# Altium footprint library Potentiometer.PcbLib: 55 footprints (part 4 of 4)
Each footprint in its own frame and in the unit in brackets; x right, y up, seen from the top. Pads: shape width x height; smd on the part's side, far side on the other; paste and mask are expansions set on the pad; w line width, h text height; cw(c..) or ccw(c..) is an arc to the next point about the centre after c.
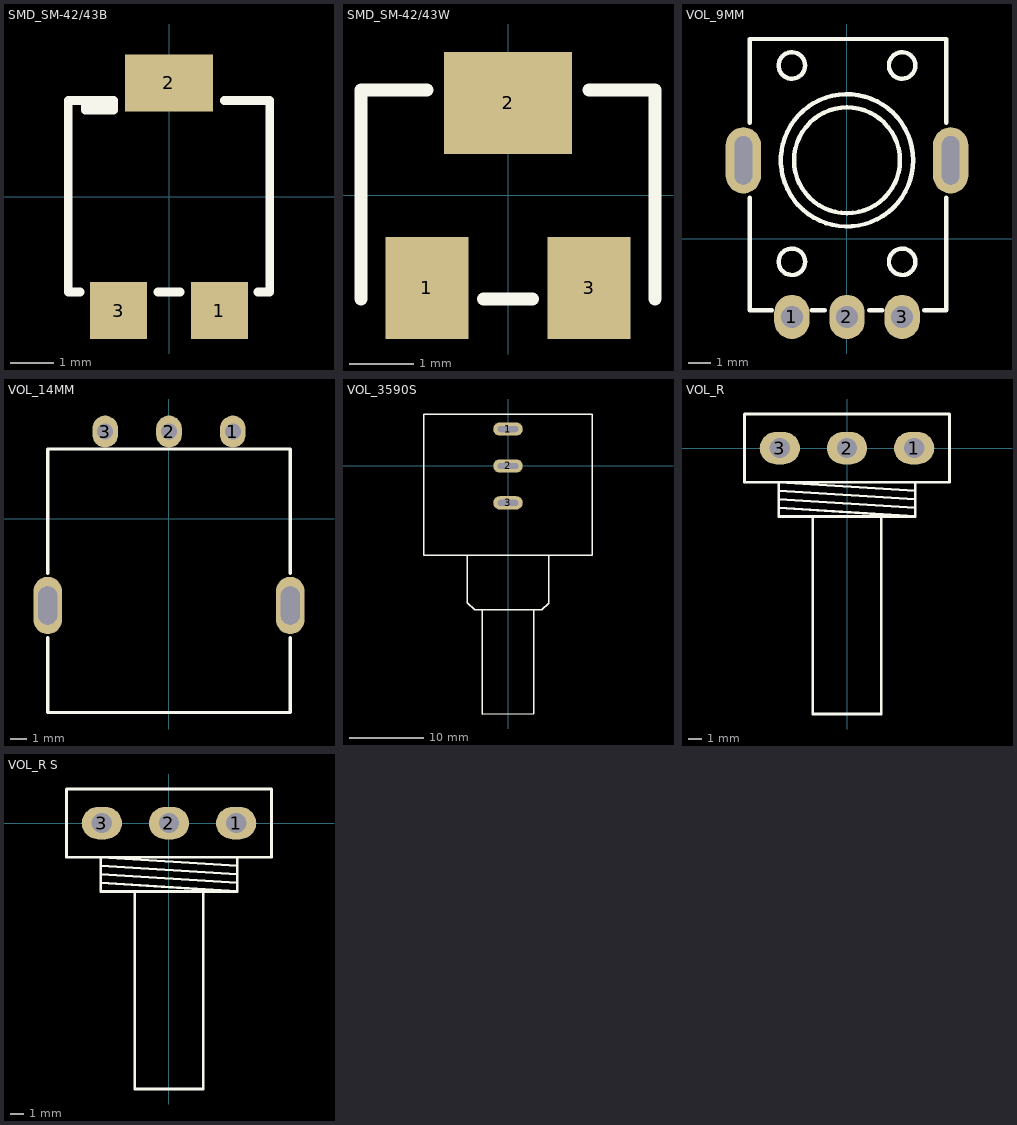
[diagram p3: the footprints below, top view; thin cyan lines are the x and y axes]

## SMD_SM-42/43B [mm]
pads (3):
  rect 1.3x1.3 smd: 1(1.15,-2.6) 3(-1.15,-2.6)
  rect 2x1.3 smd: 2(0,2.6)
Top Overlay:
  rectangle: -1.905,1.975 -1.27,2.3
  lines w0.203: -2.032,-2.175 -2.3,-2.175 -2.3,2.2 -1.27,2.2 -1.27,1.975 -1.905,1.975 -1.905,2.2 ; -0.254,-2.175 0.254,-2.175 ; 1.27,2.2 2.3,2.2 2.3,-2.175 2.032,-2.175
3D body "SW3dPS-Bourns 3314G potentiometer x1.STEP": height 2.55, standoff 0, extent -2.5,-3.1 2.5,3.1

## SMD_SM-42/43W [mm]
pads (3):
  rect 1.3x1.6 smd: 1(-1.27,-1.45) 3(1.27,-1.45)
  rect 2x1.6 smd: 2(0,1.45)
Top Overlay:
  lines w0.203: -2.3,-1.625 -2.3,1.65 -1.27,1.65 ; -0.381,-1.625 0.381,-1.625 ; 1.27,1.65 2.3,1.65 2.3,-1.625
3D body "SW3dPS-3224W.STEP": height 5.3, standoff 0, extent -2.4,-1.95 2.4,1.95

## VOL_9MM [mm] "VOULME  9mm Alpha Alps, RV09ACF EVUF"
height 0.508
pads (5):
  oval 1.6x2 hole 1: 1(-2.5,-3.55) 2(0,-3.55) 3(2.5,-3.55)
  oval 1.6x3 hole 0.8 slot 2.2 at 90 deg: ""(-4.7,3.55) ""(4.7,3.55)
Top Overlay:
  circle w0.2: c-2.5,-1.05 r0.6
  circle w0.2: c2.5,-1.05 r0.6
  circle w0.2: c-2.5,7.85 r0.6
  circle w0.2: c2.5,7.85 r0.6
  circle w0.2: c0,3.55 r3
  circle w0.2: c0,3.55 r2.4
  lines w0.2: -4.4,1.85 -4.4,-3.25 -3.4,-3.25 ; -4.4,5.25 -4.4,9.05 4.5,9.05 4.5,5.25 ; -1.6,-3.25 -1,-3.25 ; 1,-3.25 1.6,-3.25 ; 3.5,-3.25 4.5,-3.25 4.5,1.85
3D body "User Library-RV09ACF-40_RK09K1130A5R.step": height 20.1, standoff -3.7, extent -4.903,-3.678 4.849,8.872

## VOL_14MM [mm] "VOULME  14mm, RV141F-40E3"
height 0.508
pads (5):
  oval 1.6x2 hole 1: 1(4,5.45) 2(0,5.45) 3(-4,5.45)
  oval 1.8x3.6 hole 1.2 slot 2.4 at 90 deg: ""(-7.6,-5.45) ""(7.6,-5.45)
Top Overlay:
  lines w0.2: -7.6,-7.45 -7.6,-12.15 7.6,-12.15 7.6,-7.45 ; -7.6,-3.45 -7.6,4.35 7.6,4.35 7.6,-3.45
3D body "User Library-RV141F-40E3-18BL-003.step": height 24.8, standoff -3.5, extent -8.201,-12.428 8.198,5.65

## VOL_3590S [mm] "VOULME 3590S"
height 0.508
pads (3):
  oval 4x1.8 hole 0.8 slot 2.8 at 0 deg: 1(0,5) 2(0,0) 3(0,-5)
Top Overlay:
  lines w0.2: -5.5,-12.14 -5.5,-18.5 -4.5,-19.5 4.6,-19.5 5.5,-18.6 5.5,-12.14 ; -3.5,-19.5 -3.5,-33.6 3.5,-33.6 3.5,-19.5 ; -11.4,-12.1 11.4,-12.1 11.4,7.04 -11.4,7.04 -11.4,-12.1
3D body "User Library-Bourns 3590S-2-502L.step": height 23.09, standoff -3.73, extent -11.3,-33.5 11.3,6.9

## VOL_R [mm] "VOULME RIGHT ANGLE"
height 0.508
pads (3):
  oval 3x2.4 hole 1.5: 1(5,0) 2(0,0) 3(-5,0)
Top Overlay:
  lines w0.2: -5.08,-4.445 5.08,-5.08 ; -5.08,-3.81 5.08,-4.445 ; -5.08,-3.175 5.08,-3.81 ; -2.54,-5.08 -2.54,-19.781 2.54,-19.781 2.54,-5.08 ; 5.08,-3.175 -5.08,-2.54 -5.08,-5.08 5.08,-5.08 ; 5.08,-2.54 5.08,-5.08 ; -7.62,-2.54 -7.62,2.54 7.62,2.54 7.62,-2.54 -7.62,-2.54
3D body "SW3dPS-Pot.STEP": height 20.64, standoff -4, extent -7.801,-20.56 7.947,4.998

## VOL_R S [mm] "VOULME RIGHT ANGLE"
height 0.508
pads (3):
  oval 3x2.4 hole 1.5: 1(5,0) 2(0,0) 3(-5,0)
Top Overlay:
  lines w0.2: -5.08,-4.445 5.08,-5.08 ; -5.08,-3.81 5.08,-4.445 ; -5.08,-3.175 5.08,-3.81 ; -2.54,-5.08 -2.54,-19.781 2.54,-19.781 2.54,-5.08 ; 5.08,-3.175 -5.08,-2.54 -5.08,-5.08 5.08,-5.08 ; 5.08,-2.54 5.08,-5.08 ; -7.62,-2.54 -7.62,2.54 7.62,2.54 7.62,-2.54 -7.62,-2.54
3D body "SW3dPS-Pot.STEP": height 20.64, standoff -4, extent -7.801,-20.56 7.947,4.998
3D body "volome cover2.STEP": height 24.54, standoff 2.14, extent -10.932,-27.8 10.761,-7.8